# Altium footprint library CONN_TBLOCK.PcbLib: 69 footprints (part 1 of 5)
Each footprint in its own frame and in the unit in brackets; x right, y up, seen from the top. Pads: shape width x height; smd on the part's side, far side on the other; paste and mask are expansions set on the pad; w line width, h text height; cw(c..) or ccw(c..) is an arc to the next point about the centre after c.
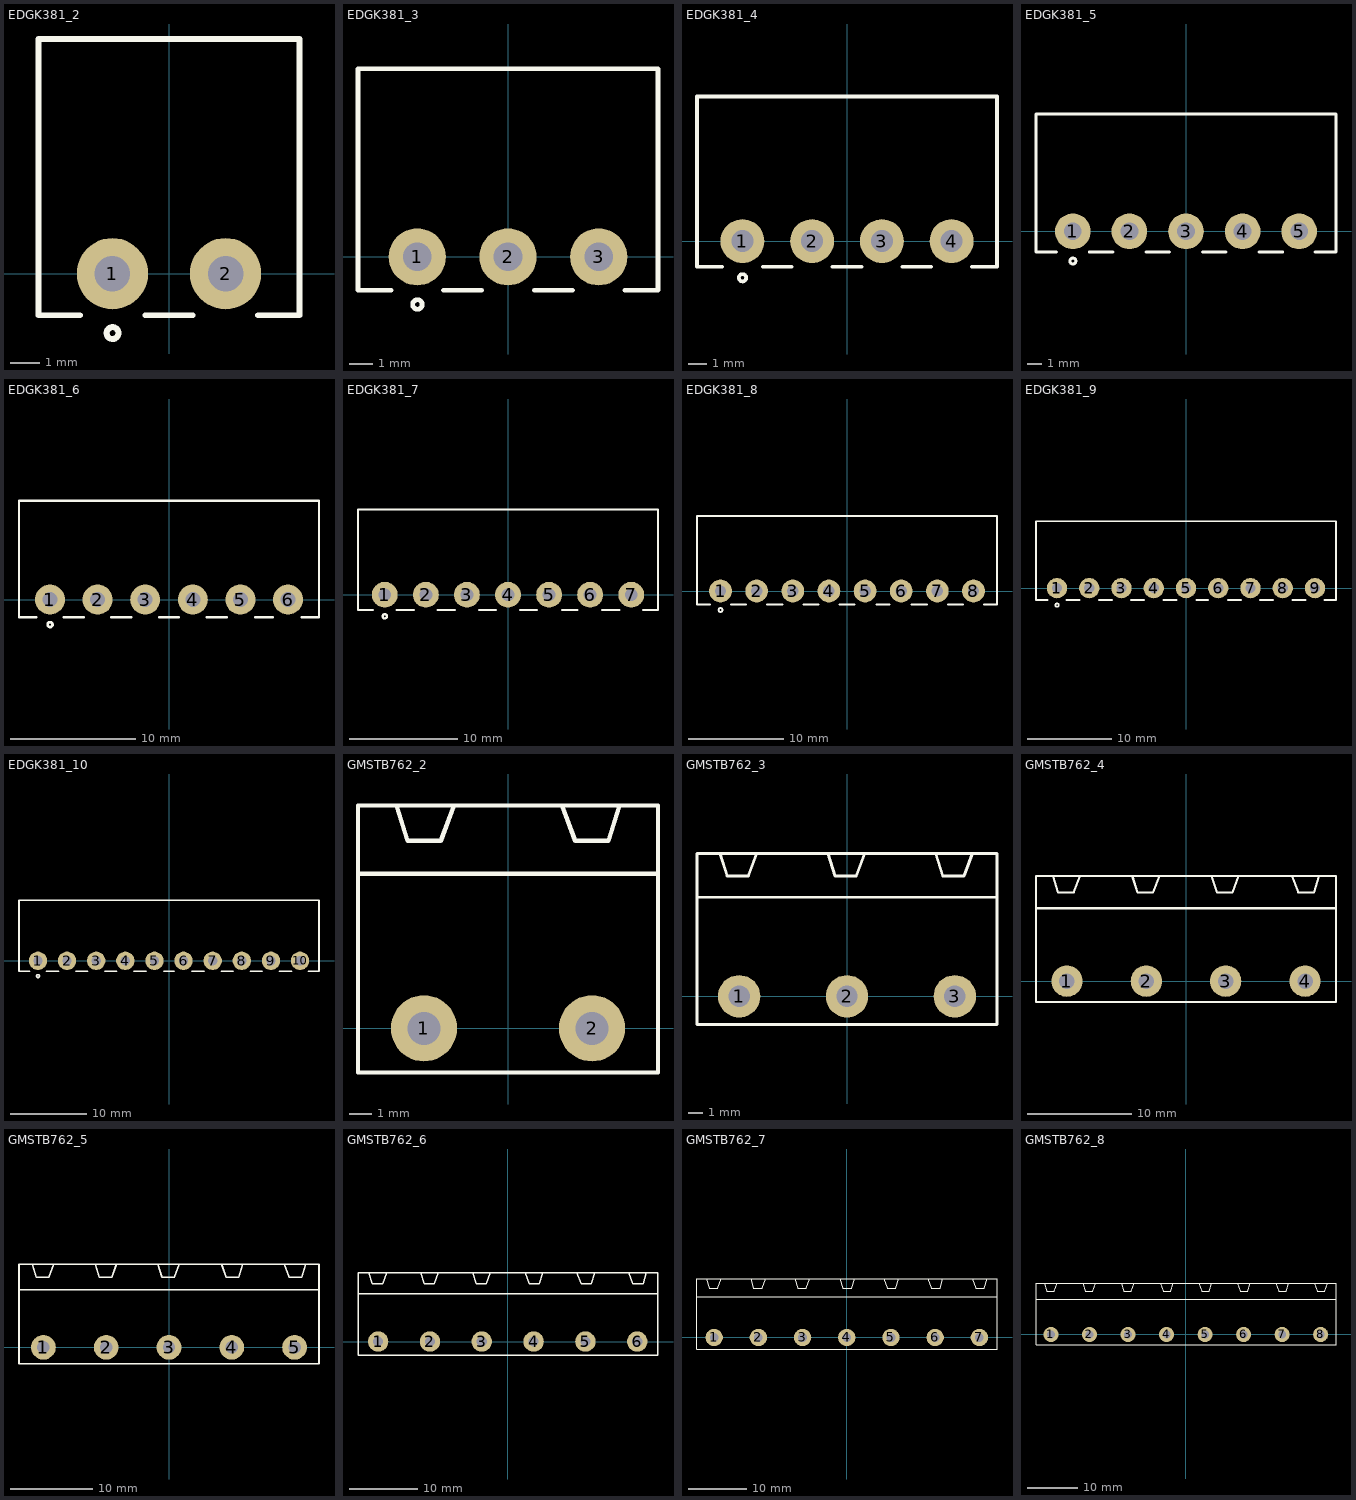
[diagram p0: the footprints below, top view; thin cyan lines are the x and y axes]

## EDGK381_2 [mm] "PHOENIX MC 1.5, EDGK-3.81, 3.81mm pitch, 2pin"
height 6.5
pads (2):
  round 2.4 hole 1.2: 1(-1.905,0) 2(1.905,0)
Top Overlay:
  circle w0.2: c-1.9,-2 r0.2
  lines w0.2: -3,-1.4 -4.4,-1.4 -4.4,7.9 4.4,7.9 4.4,-1.4 3,-1.4 ; -0.8,-1.4 0.8,-1.4
3D body "User Library-KEFA 3_81mm_2pin_RA.STEP": height 7.98, standoff -3.3, extent -4.505,-1.3 4.505,17.1

## EDGK381_3 [mm] "PHOENIX MC 1.5, EDGK-3.81, 3.81mm pitch, 3pin"
height 6.5
pads (3):
  round 2.4 hole 1.2: 1(-3.81,0) 2(0,0) 3(3.81,0)
Top Overlay:
  circle w0.2: c-3.805,-2 r0.2
  lines w0.2: -4.905,-1.4 -6.3,-1.4 -6.3,7.9 6.3,7.9 6.3,-1.4 4.9,-1.4 ; -2.705,-1.4 -1.105,-1.4 ; 1.105,-1.4 2.705,-1.4
3D body "User Library-KEFA 3_81mm_3pin_RA.STEP": height 7.98, standoff -3.3, extent -6.41,-1.3 6.41,17.1

## EDGK381_4 [mm] "PHOENIX MC 1.5, EDGK-3.81, 3.81mm pitch, 4pin"
height 6.5
pads (4):
  round 2.4 hole 1.2: 1(-5.715,0) 2(-1.905,0) 3(1.905,0) 4(5.715,0)
Top Overlay:
  circle w0.2: c-5.71,-2 r0.2
  lines w0.2: -6.81,-1.4 -8.195,-1.4 -8.195,7.9 8.195,7.9 8.195,-1.4 6.81,-1.4 ; -4.61,-1.4 -3.01,-1.4 ; -0.8,-1.4 0.8,-1.4 ; 3.01,-1.4 4.61,-1.4
3D body "User Library-KEFA 3_81mm_4pin_RA.STEP": height 7.98, standoff -3.3, extent -8.315,-1.3 8.315,17.1

## EDGK381_5 [mm] "PHOENIX MC 1.5, EDGK-3.81, 3.81mm pitch, 5pin"
height 6.5
pads (5):
  round 2.4 hole 1.2: 1(-7.62,0) 2(-3.81,0) 3(0,0) 4(3.81,0) 5(7.62,0)
Top Overlay:
  circle w0.2: c-7.615,-2 r0.2
  lines w0.2: -8.715,-1.4 -10.1,-1.4 -10.1,7.9 10.1,7.9 10.1,-1.4 8.7,-1.4 ; -6.515,-1.4 -4.915,-1.4 ; -2.705,-1.4 -1.105,-1.4 ; 1.105,-1.4 2.705,-1.4 ; 4.915,-1.4 6.515,-1.4
3D body "User Library-KEFA 3_81mm_5pin_RA.STEP": height 7.98, standoff -3.3, extent -10.22,-1.3 10.22,17.1

## EDGK381_6 [mm] "PHOENIX MC 1.5, EDGK-3.81, 3.81mm pitch, 6pin"
height 6.5
pads (6):
  round 2.4 hole 1.2: 1(-9.525,0) 2(-5.715,0) 3(-1.905,0) 4(1.905,0) 5(5.715,0) 6(9.525,0)
Top Overlay:
  circle w0.2: c-9.52,-2 r0.2
  lines w0.2: -10.62,-1.4 -12.005,-1.4 -12.005,7.9 12.005,7.9 12.005,-1.4 10.62,-1.4 ; -8.42,-1.4 -6.82,-1.4 ; -4.61,-1.4 -3.01,-1.4 ; -0.8,-1.4 0.8,-1.4 ; 3.01,-1.4 4.61,-1.4 ; 6.92,-1.4 8.32,-1.4
3D body "User Library-KEFA 3_81mm_6pin_RA.STEP": height 7.98, standoff -3.3, extent -12.125,-1.3 12.125,17.1

## EDGK381_7 [mm] "PHOENIX MC 1.5, EDGK-3.81, 3.81mm pitch, 7pin"
height 6.5
pads (7):
  round 2.4 hole 1.2: 1(-11.43,0) 2(-7.62,0) 3(-3.81,0) 4(0,0) 5(3.81,0) 6(7.62,0) 7(11.43,0)
Top Overlay:
  circle w0.2: c-11.425,-2 r0.2
  lines w0.2: -12.525,-1.4 -13.91,-1.4 -13.91,7.9 13.91,7.9 13.91,-1.4 12.525,-1.4 ; -10.325,-1.4 -8.725,-1.4 ; -6.515,-1.4 -4.915,-1.4 ; -2.705,-1.4 -1.105,-1.4 ; 1.105,-1.4 2.705,-1.4 ; 5.015,-1.4 6.415,-1.4 ; 8.725,-1.4 10.325,-1.4
3D body "User Library-KEFA 3_81mm_7pin_RA.STEP": height 7.98, standoff -3.3, extent -14.03,-1.3 14.03,17.1

## EDGK381_8 [mm] "PHOENIX MC 1.5, EDGK-3.81, 3.81mm pitch, 8pin"
height 6.5
pads (8):
  round 2.4 hole 1.2: 1(-13.335,0) 2(-9.525,0) 3(-5.715,0) 4(-1.905,0) 5(1.905,0) 6(5.715,0) 7(9.525,0) 8(13.335,0)
Top Overlay:
  circle w0.2: c-13.33,-2 r0.2
  lines w0.2: -14.43,-1.4 -15.815,-1.4 -15.815,7.9 15.815,7.9 15.815,-1.4 14.43,-1.4 ; -12.23,-1.4 -10.63,-1.4 ; -8.42,-1.4 -6.82,-1.4 ; -4.61,-1.4 -3.01,-1.4 ; -0.8,-1.4 0.8,-1.4 ; 3.11,-1.4 4.51,-1.4 ; 6.82,-1.4 8.42,-1.4 ; 10.63,-1.4 12.23,-1.4
3D body "User Library-KEFA 3_81mm_8pin_RA.STEP": height 7.98, standoff -3.3, extent -15.935,-1.3 15.935,17.1

## EDGK381_9 [mm] "PHOENIX MC 1.5, EDGK-3.81, 3.81mm pitch, 9pin"
height 6.5
pads (9):
  round 2.4 hole 1.2: 1(-15.24,0) 2(-11.43,0) 3(-7.62,0) 4(-3.81,0) 5(0,0) 6(3.81,0) 7(7.62,0) 8(11.43,0) 9(15.24,0)
Top Overlay:
  circle w0.2: c-15.235,-2 r0.2
  lines w0.2: -16.335,-1.4 -17.72,-1.4 -17.72,7.9 17.72,7.9 17.72,-1.4 16.335,-1.4 ; -14.135,-1.4 -12.535,-1.4 ; -10.325,-1.4 -8.725,-1.4 ; -6.515,-1.4 -4.915,-1.4 ; -2.705,-1.4 -1.105,-1.4 ; 1.205,-1.4 2.605,-1.4 ; 4.915,-1.4 6.515,-1.4 ; 8.725,-1.4 10.325,-1.4 ; 12.535,-1.4 14.135,-1.4
3D body "User Library-KEFA 3_81mm_9pin_RA.STEP": height 7.98, standoff -3.3, extent -17.84,-1.3 17.84,17.1

## EDGK381_10 [mm] "PHOENIX MC 1.5, EDGK-3.81, 3.81mm pitch, 10pin"
height 6.5
pads (10):
  round 2.4 hole 1.2: 1(-17.145,0) 2(-13.335,0) 3(-9.525,0) 4(-5.715,0) 5(-1.905,0) 6(1.905,0) 7(5.715,0) 8(9.525,0) 9(13.335,0) 10(17.145,0)
Top Overlay:
  circle w0.2: c-17.14,-2 r0.2
  lines w0.2: -18.24,-1.4 -19.625,-1.4 -19.625,7.9 19.625,7.9 19.625,-1.4 18.24,-1.4 ; -16.04,-1.4 -14.44,-1.4 ; -12.23,-1.4 -10.63,-1.4 ; -8.42,-1.4 -6.82,-1.4 ; -4.61,-1.4 -3.01,-1.4 ; -0.7,-1.4 0.7,-1.4 ; 3.01,-1.4 4.61,-1.4 ; 10.63,-1.4 12.23,-1.4 ; 14.44,-1.4 16.04,-1.4 ; 6.82,-1.4 8.42,-1.4 6.82,-1.4
3D body "User Library-KEFA 3_81mm_10pin_RA.STEP": height 7.98, standoff -3.3, extent -19.745,-1.3 19.745,17.1

## GMSTB762_2 [mm] "PHOENIX, GMSTB 2,5/2-G-7,62, 7.62mm pitch, 2pin"
pads (2):
  round 3 hole 1.5: 1(-3.81,0) 2(3.81,0)
Top Overlay:
  lines w0.2: -6.8,7 6.8,7 ; -5.05,10.1 -4.55,8.5 -3.05,8.5 -2.45,10.1 ; 2.45,10.1 3.05,8.5 4.55,8.5 5.05,10.1 ; -6.8,-2 -6.8,10.1 6.8,10.1 6.8,-2 -6.8,-2
3D body "GMSTB-2-5-2-G-7-62_3D.stp": height 9.1, standoff -3, extent -6.72,-1.9 6.72,10.102

## GMSTB762_3 [mm] "PHOENIX, GMSTB 2,5/3-G-7,62, 7.62mm pitch, 3pin"
pads (3):
  round 3 hole 1.5: 1(-7.62,0) 2(0,0) 3(7.62,0)
Top Overlay:
  lines w0.2: -10.6,7 10.6,7 ; -8.97,10.1 -8.47,8.5 -6.97,8.5 -6.37,10.1 ; -1.35,10.1 -0.85,8.5 0.65,8.5 1.25,10.1 ; 6.27,10.1 6.77,8.5 8.27,8.5 8.87,10.1 ; -10.6,-2 10.6,-2 10.6,10.1 -10.6,10.1 -10.6,-2
3D body "GMSTB-2-5-3-G-7-62_3D.stp": height 9.1, standoff -3, extent -10.53,-1.9 10.53,10.102

## GMSTB762_4 [mm] "PHOENIX, GMSTB 2,5/4-G-7,62, 7.62mm pitch, 4pin"
pads (4):
  round 3 hole 1.5: 1(-11.43,0) 2(-3.81,0) 3(3.81,0) 4(11.43,0)
Top Overlay:
  lines w0.2: -14.4,7 14.4,7 ; -12.78,10.1 -12.28,8.5 -10.78,8.5 -10.18,10.1 ; -5.16,10.1 -4.66,8.5 -3.16,8.5 -2.56,10.1 ; 2.46,10.1 2.96,8.5 4.46,8.5 5.06,10.1 ; 10.18,10.1 10.78,8.5 12.28,8.5 12.78,10.1 ; -14.4,-2 -14.4,10.1 14.4,10.1 14.4,-2 -14.4,-2
3D body "GMSTB-2-5-4-G-7-62_3D.stp": height 9.1, standoff -3, extent -14.34,-1.9 14.34,10.102

## GMSTB762_5 [mm] "PHOENIX, GMSTB 2,5/5-G-7,62, 7.62mm pitch, 5pin"
pads (5):
  round 3 hole 1.5: 1(-15.24,0) 2(-7.62,0) 3(0,0) 4(7.62,0) 5(15.24,0)
Top Overlay:
  lines w0.2: -18.2,7 18.2,7 ; -16.59,10.1 -16.09,8.5 -14.59,8.5 -13.99,10.1 ; -8.97,10.1 -8.47,8.5 -6.97,8.5 -6.37,10.1 ; -1.35,10.1 -0.85,8.5 0.65,8.5 1.25,10.1 ; 6.37,10.1 6.97,8.5 8.47,8.5 8.97,10.1 ; 13.99,10.1 14.59,8.5 16.09,8.5 16.59,10.1 ; -18.2,-2 18.2,-2 18.2,10.1 -18.2,10.1 -18.2,-2
3D body "GMSTB-2-5-5-G-7-62_3D.stp": height 9.1, standoff -3, extent -18.15,-1.9 18.15,10.102

## GMSTB762_6 [mm] "PHOENIX, GMSTB 2,5/6-G-7,62, 7.62mm pitch, 6pin"
pads (6):
  round 3 hole 1.5: 1(-19.05,0) 2(-11.43,0) 3(-3.81,0) 4(3.81,0) 5(11.43,0) 6(19.05,0)
Top Overlay:
  lines w0.2: -22.01,7 22.1,7 ; -20.4,10.1 -19.9,8.5 -18.4,8.5 -17.8,10.1 ; -12.78,10.1 -12.28,8.5 -10.78,8.5 -10.18,10.1 ; -5.16,10.1 -4.66,8.5 -3.16,8.5 -2.56,10.1 ; 2.56,10.1 3.16,8.5 4.66,8.5 5.16,10.1 ; 10.18,10.1 10.78,8.5 12.28,8.5 12.78,10.1 ; 17.8,10.1 18.4,8.5 19.9,8.5 20.4,10.1 ; -22.01,-2 -22.01,10.1 22.1,10.1 22.1,-2 -22.01,-2
3D body "GMSTB-2-5-6-G-7-62_3D.stp": height 9.1, standoff -3, extent -21.96,-1.9 21.96,10.102

## GMSTB762_7 [mm] "PHOENIX, GMSTB 2,5/7-G-7,62, 7.62mm pitch, 7pin"
pads (7):
  round 3 hole 1.5: 1(-22.86,0) 2(-15.24,0) 3(-7.62,0) 4(0,0) 5(7.62,0) 6(15.24,0) 7(22.86,0)
Top Overlay:
  lines w0.2: -25.82,7 25.9,7 ; -24.21,10.1 -23.71,8.5 -22.21,8.5 -21.61,10.1 ; -16.59,10.1 -16.09,8.5 -14.59,8.5 -13.99,10.1 ; -8.97,10.1 -8.47,8.5 -6.97,8.5 -6.37,10.1 ; -1.25,10.1 -0.65,8.5 0.85,8.5 1.35,10.1 ; 6.37,10.1 6.97,8.5 8.47,8.5 8.97,10.1 ; 13.99,10.1 14.59,8.5 16.09,8.5 16.59,10.1 ; 21.61,10.1 22.21,8.5 23.71,8.5 24.21,10.1 ; -25.82,-2 -25.82,10.1 25.9,10.1 25.9,-2 -25.82,-2
3D body "GMSTB-2-5-7-G-7-62_3D.stp": height 9.1, standoff -3, extent -25.77,-1.9 25.77,10.102

## GMSTB762_8 [mm] "PHOENIX, GMSTB 2,5/8-G-7,62, 7.62mm pitch, 8pin"
pads (8):
  round 3 hole 1.5: 1(-26.67,0) 2(-19.05,0) 3(-11.43,0) 4(-3.81,0) 5(3.81,0) 6(11.43,0) 7(19.05,0) 8(26.67,0)
Top Overlay:
  lines w0.2: -29.63,7 29.7,7 ; -28.02,10.1 -27.52,8.5 -26.02,8.5 -25.42,10.1 ; -20.4,10.1 -19.9,8.5 -18.4,8.5 -17.8,10.1 ; -12.78,10.1 -12.28,8.5 -10.78,8.5 -10.18,10.1 ; -5.06,10.1 -4.46,8.5 -2.96,8.5 -2.46,10.1 ; 2.56,10.1 3.16,8.5 4.66,8.5 5.16,10.1 ; 10.18,10.1 10.78,8.5 12.28,8.5 12.78,10.1 ; 17.8,10.1 18.4,8.5 19.9,8.5 20.4,10.1 ; 25.42,10.1 26.02,8.5 27.52,8.5 28.02,10.1 ; -29.63,-2 29.7,-2 29.7,10.1 -29.63,10.1 -29.63,-2
3D body "GMSTB-2-5-8-G-7-62_3D.stp": height 9.1, standoff -3, extent -29.58,-1.9 29.58,10.102